# Altium footprint library Connector-Header.PcbLib: 166 footprints (part 6 of 11)
Each footprint in its own frame and in the unit in brackets; x right, y up, seen from the top. Pads: shape width x height; smd on the part's side, far side on the other; paste and mask are expansions set on the pad; w line width, h text height; cw(c..) or ccw(c..) is an arc to the next point about the centre after c.
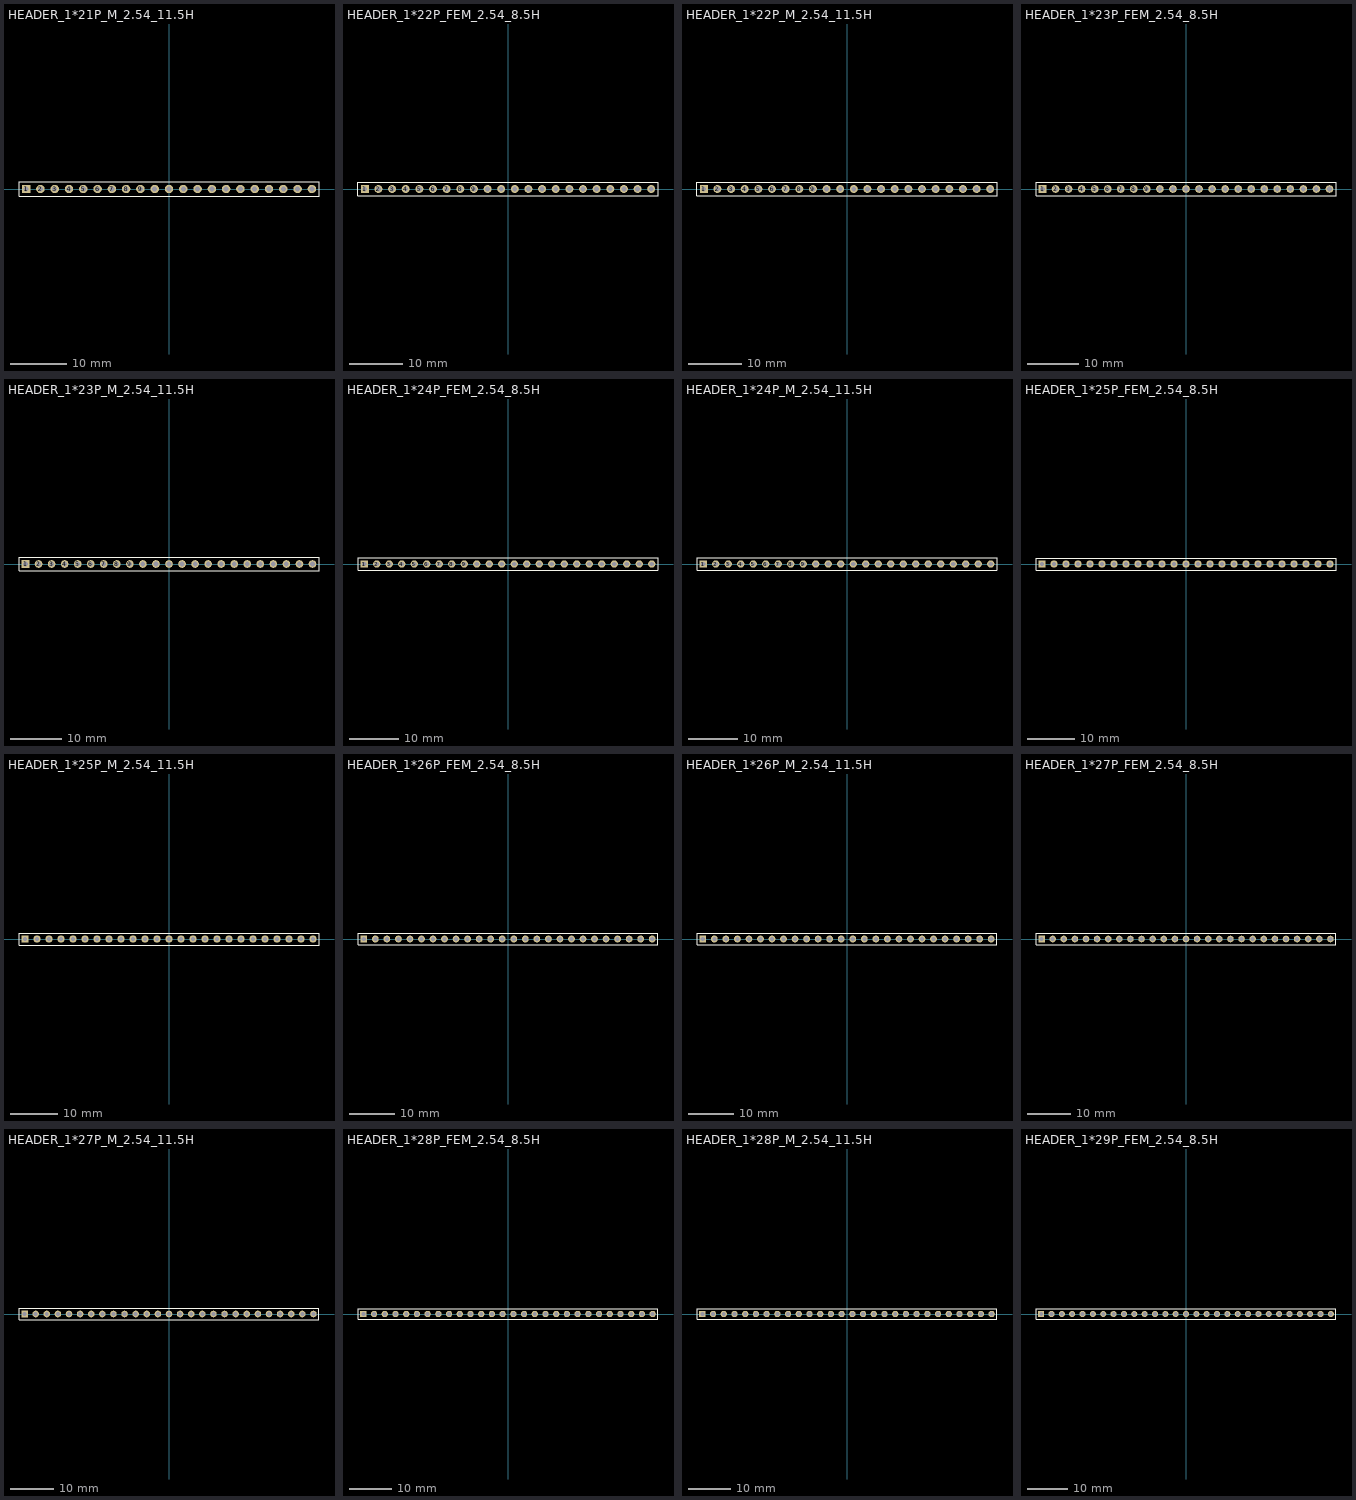
[diagram p5: the footprints below, top view; thin cyan lines are the x and y axes]

## HEADER_1*21P_M_2.54_11.5H [mm] "Connector; Header; 21 Position"
pads (21):
  rect 1.5x1.5 hole 0.9: 1(-25.4,0)
  round 1.5 hole 0.9: 2(-22.86,0) 3(-20.32,0) 4(-17.78,0) 5(-15.24,0) 6(-12.7,0) 7(-10.16,0) 8(-7.62,0) 9(-5.08,0) 10(-2.54,0) 11(0,0) 12(2.54,0) 13(5.08,0) 14(7.62,0) 15(10.16,0) 16(12.7,0) 17(15.24,0) 18(17.78,0) 19(20.32,0) 20(22.86,0) 21(25.4,0)
Top Overlay:
  lines w0.2: -26.67,-1.27 -26.67,1.27 -24.765,1.27 26.67,1.27 26.67,-1.27 -26.67,-1.27
3D body "PinHeader_1x21_P2.54mm_Vertical.step": height 8.54, standoff -3, extent -26.67,-1.27 26.67,1.27

## HEADER_1*22P_FEM_2.54_8.5H [mm] "Connector; Header; 22 Position"
pads (22):
  rect 1.5x1.5 hole 0.9: 1(-26.67,0)
  round 1.5 hole 0.9: 2(-24.13,0) 3(-21.59,0) 4(-19.05,0) 5(-16.51,0) 6(-13.97,0) 7(-11.43,0) 8(-8.89,0) 9(-6.35,0) 10(-3.81,0) 11(-1.27,0) 12(1.27,0) 13(3.81,0) 14(6.35,0) 15(8.89,0) 16(11.43,0) 17(13.97,0) 18(16.51,0) 19(19.05,0) 20(21.59,0) 21(24.13,0) 22(26.67,0)
Top Overlay:
  lines w0.2: 27.889,1.27 -26.035,1.27 -27.94,1.27 -27.94,-1.27 27.94,-1.27 27.94,1.27
3D body "PinSocket_1x22_P2.54mm_Vertical.step": height 7, standoff -3.1, extent -27.94,-1.27 27.94,1.27

## HEADER_1*22P_M_2.54_11.5H [mm] "Connector; Header; 22 Position"
pads (22):
  rect 1.5x1.5 hole 0.9: 1(-26.67,0)
  round 1.5 hole 0.9: 2(-24.13,0) 3(-21.59,0) 4(-19.05,0) 5(-16.51,0) 6(-13.97,0) 7(-11.43,0) 8(-8.89,0) 9(-6.35,0) 10(-3.81,0) 11(-1.27,0) 12(1.27,0) 13(3.81,0) 14(6.35,0) 15(8.89,0) 16(11.43,0) 17(13.97,0) 18(16.51,0) 19(19.05,0) 20(21.59,0) 21(24.13,0) 22(26.67,0)
Top Overlay:
  lines w0.2: 27.889,1.27 -26.035,1.27 -27.94,1.27 -27.94,-1.27 27.94,-1.27 27.94,1.27
3D body "PinHeader_1x22_P2.54mm_Vertical.step": height 8.54, standoff -3, extent -27.94,-1.27 27.94,1.27

## HEADER_1*23P_FEM_2.54_8.5H [mm] "Connector; Header; 23 Position"
pads (23):
  rect 1.5x1.5 hole 0.9: 1(-27.94,0)
  round 1.5 hole 0.9: 2(-25.4,0) 3(-22.86,0) 4(-20.32,0) 5(-17.78,0) 6(-15.24,0) 7(-12.7,0) 8(-10.16,0) 9(-7.62,0) 10(-5.08,0) 11(-2.54,0) 12(0,0) 13(2.54,0) 14(5.08,0) 15(7.62,0) 16(10.16,0) 17(12.7,0) 18(15.24,0) 19(17.78,0) 20(20.32,0) 21(22.86,0) 22(25.4,0) 23(27.94,0)
Top Overlay:
  lines w0.2: -29.21,-1.27 -29.21,1.27 -27.305,1.27 29.21,1.27 29.21,-1.27 -29.21,-1.27
3D body "PinSocket_1x23_P2.54mm_Vertical.step": height 7, standoff -3.1, extent -29.21,-1.27 29.21,1.27

## HEADER_1*23P_M_2.54_11.5H [mm] "Connector; Header; 23 Position"
pads (23):
  rect 1.5x1.5 hole 0.9: 1(-27.94,0)
  round 1.5 hole 0.9: 2(-25.4,0) 3(-22.86,0) 4(-20.32,0) 5(-17.78,0) 6(-15.24,0) 7(-12.7,0) 8(-10.16,0) 9(-7.62,0) 10(-5.08,0) 11(-2.54,0) 12(0,0) 13(2.54,0) 14(5.08,0) 15(7.62,0) 16(10.16,0) 17(12.7,0) 18(15.24,0) 19(17.78,0) 20(20.32,0) 21(22.86,0) 22(25.4,0) 23(27.94,0)
Top Overlay:
  lines w0.2: -29.21,-1.27 29.21,-1.27 29.21,1.27 -27.305,1.27 -29.21,1.27 -29.21,-1.27
3D body "PinHeader_1x23_P2.54mm_Vertical.step": height 8.54, standoff -3, extent -29.21,-1.27 29.21,1.27

## HEADER_1*24P_FEM_2.54_8.5H [mm] "Connector; Header; 24 Position"
pads (24):
  rect 1.5x1.5 hole 0.9: 1(-29.21,0)
  round 1.5 hole 0.9: 2(-26.67,0) 3(-24.13,0) 4(-21.59,0) 5(-19.05,0) 6(-16.51,0) 7(-13.97,0) 8(-11.43,0) 9(-8.89,0) 10(-6.35,0) 11(-3.81,0) 12(-1.27,0) 13(1.27,0) 14(3.81,0) 15(6.35,0) 16(8.89,0) 17(11.43,0) 18(13.97,0) 19(16.51,0) 20(19.05,0) 21(21.59,0) 22(24.13,0) 23(26.67,0) 24(29.21,0)
Top Overlay:
  lines w0.2: 30.455,-1.27 -30.48,-1.27 -30.48,1.27 -28.575,1.27 30.455,1.27 ; 30.48,-1.27 30.48,1.27
3D body "PinSocket_1x24_P2.54mm_Vertical.step": height 7, standoff -3.1, extent -30.48,-1.27 30.48,1.27

## HEADER_1*24P_M_2.54_11.5H [mm] "Connector; Header; 24 Position"
pads (24):
  rect 1.5x1.5 hole 0.9: 1(-29.21,0)
  round 1.5 hole 0.9: 2(-26.67,0) 3(-24.13,0) 4(-21.59,0) 5(-19.05,0) 6(-16.51,0) 7(-13.97,0) 8(-11.43,0) 9(-8.89,0) 10(-6.35,0) 11(-3.81,0) 12(-1.27,0) 13(1.27,0) 14(3.81,0) 15(6.35,0) 16(8.89,0) 17(11.43,0) 18(13.97,0) 19(16.51,0) 20(19.05,0) 21(21.59,0) 22(24.13,0) 23(26.67,0) 24(29.21,0)
Top Overlay:
  lines w0.2: 30.455,-1.27 -30.48,-1.27 -30.48,1.27 -28.575,1.27 30.455,1.27 ; 30.48,-1.27 30.48,1.27
3D body "PinHeader_1x24_P2.54mm_Vertical.step": height 8.54, standoff -3, extent -30.48,-1.27 30.48,1.27

## HEADER_1*25P_FEM_2.54_8.5H [mm] "Connector; Header; 25 Position"
pads (25):
  rect 1.5x1.5 hole 0.9: 1(-30.48,0)
  round 1.5 hole 0.9: 2(-27.94,0) 3(-25.4,0) 4(-22.86,0) 5(-20.32,0) 6(-17.78,0) 7(-15.24,0) 8(-12.7,0) 9(-10.16,0) 10(-7.62,0) 11(-5.08,0) 12(-2.54,0) 13(0,0) 14(2.54,0) 15(5.08,0) 16(7.62,0) 17(10.16,0) 18(12.7,0) 19(15.24,0) 20(17.78,0) 21(20.32,0) 22(22.86,0) 23(25.4,0) 24(27.94,0) 25(30.48,0)
Top Overlay:
  lines w0.2: -31.75,-1.27 -31.75,1.27 -29.845,1.27 31.75,1.27 31.75,-1.27 -31.75,-1.27
3D body "PinSocket_1x25_P2.54mm_Vertical.step": height 7, standoff -3.1, extent -31.75,-1.27 31.75,1.27

## HEADER_1*25P_M_2.54_11.5H [mm] "Connector; Header; 25 Position"
pads (25):
  rect 1.5x1.5 hole 0.9: 1(-30.48,0)
  round 1.5 hole 0.9: 2(-27.94,0) 3(-25.4,0) 4(-22.86,0) 5(-20.32,0) 6(-17.78,0) 7(-15.24,0) 8(-12.7,0) 9(-10.16,0) 10(-7.62,0) 11(-5.08,0) 12(-2.54,0) 13(0,0) 14(2.54,0) 15(5.08,0) 16(7.62,0) 17(10.16,0) 18(12.7,0) 19(15.24,0) 20(17.78,0) 21(20.32,0) 22(22.86,0) 23(25.4,0) 24(27.94,0) 25(30.48,0)
Top Overlay:
  lines w0.2: -31.75,-1.27 31.75,-1.27 31.75,1.27 -29.845,1.27 -31.75,1.27 -31.75,-1.27
3D body "PinHeader_1x25_P2.54mm_Vertical.step": height 8.54, standoff -3, extent -31.75,-1.27 31.75,1.27

## HEADER_1*26P_FEM_2.54_8.5H [mm] "Connector; Header; 26 Position"
pads (26):
  rect 1.5x1.5 hole 0.9: 1(-31.75,0)
  round 1.5 hole 0.9: 2(-29.21,0) 3(-26.67,0) 4(-24.13,0) 5(-21.59,0) 6(-19.05,0) 7(-16.51,0) 8(-13.97,0) 9(-11.43,0) 10(-8.89,0) 11(-6.35,0) 12(-3.81,0) 13(-1.27,0) 14(1.27,0) 15(3.81,0) 16(6.35,0) 17(8.89,0) 18(11.43,0) 19(13.97,0) 20(16.51,0) 21(19.05,0) 22(21.59,0) 23(24.13,0) 24(26.67,0) 25(29.21,0) 26(31.75,0)
Top Overlay:
  lines w0.2: -33.02,-1.27 -33.02,1.27 -31.115,1.27 33.02,1.27 33.02,-1.27 -33.02,-1.27
3D body "PinSocket_1x26_P2.54mm_Vertical.step": height 7, standoff -3.1, extent -33.02,-1.27 33.02,1.27

## HEADER_1*26P_M_2.54_11.5H [mm] "Connector; Header; 26 Position"
pads (26):
  rect 1.5x1.5 hole 0.9: 1(-31.75,0)
  round 1.5 hole 0.9: 2(-29.21,0) 3(-26.67,0) 4(-24.13,0) 5(-21.59,0) 6(-19.05,0) 7(-16.51,0) 8(-13.97,0) 9(-11.43,0) 10(-8.89,0) 11(-6.35,0) 12(-3.81,0) 13(-1.27,0) 14(1.27,0) 15(3.81,0) 16(6.35,0) 17(8.89,0) 18(11.43,0) 19(13.97,0) 20(16.51,0) 21(19.05,0) 22(21.59,0) 23(24.13,0) 24(26.67,0) 25(29.21,0) 26(31.75,0)
Top Overlay:
  lines w0.2: -33.02,-1.27 33.02,-1.27 33.02,1.27 -31.115,1.27 -33.02,1.27 -33.02,-1.27
3D body "PinHeader_1x26_P2.54mm_Vertical.step": height 8.54, standoff -3, extent -33.02,-1.27 33.02,1.27

## HEADER_1*27P_FEM_2.54_8.5H [mm] "Connector; Header; 27 Position"
pads (27):
  rect 1.5x1.5 hole 0.9: 1(-33.02,0)
  round 1.5 hole 0.9: 2(-30.48,0) 3(-27.94,0) 4(-25.4,0) 5(-22.86,0) 6(-20.32,0) 7(-17.78,0) 8(-15.24,0) 9(-12.7,0) 10(-10.16,0) 11(-7.62,0) 12(-5.08,0) 13(-2.54,0) 14(0,0) 15(2.54,0) 16(5.08,0) 17(7.62,0) 18(10.16,0) 19(12.7,0) 20(15.24,0) 21(17.78,0) 22(20.32,0) 23(22.86,0) 24(25.4,0) 25(27.94,0) 26(30.48,0) 27(33.02,0)
Top Overlay:
  lines w0.2: -34.29,-1.27 -34.29,1.27 -32.385,1.27 34.29,1.27 34.29,-1.27 -34.29,-1.27
3D body "PinSocket_1x27_P2.54mm_Vertical.step": height 7, standoff -3.1, extent -34.29,-1.27 34.29,1.27

## HEADER_1*27P_M_2.54_11.5H [mm] "Connector; Header; 27 Position"
pads (27):
  rect 1.5x1.5 hole 0.9: 1(-33.02,0)
  round 1.5 hole 0.9: 2(-30.48,0) 3(-27.94,0) 4(-25.4,0) 5(-22.86,0) 6(-20.32,0) 7(-17.78,0) 8(-15.24,0) 9(-12.7,0) 10(-10.16,0) 11(-7.62,0) 12(-5.08,0) 13(-2.54,0) 14(0,0) 15(2.54,0) 16(5.08,0) 17(7.62,0) 18(10.16,0) 19(12.7,0) 20(15.24,0) 21(17.78,0) 22(20.32,0) 23(22.86,0) 24(25.4,0) 25(27.94,0) 26(30.48,0) 27(33.02,0)
Top Overlay:
  lines w0.2: -34.29,-1.27 34.29,-1.27 34.29,1.27 -32.385,1.27 -34.29,1.27 -34.29,-1.27
3D body "PinHeader_1x27_P2.54mm_Vertical.step": height 8.54, standoff -3, extent -34.29,-1.27 34.29,1.27

## HEADER_1*28P_FEM_2.54_8.5H [mm] "Connector; Header; 28 Position"
pads (28):
  rect 1.5x1.5 hole 0.9: 1(-34.29,0)
  round 1.5 hole 0.9: 2(-31.75,0) 3(-29.21,0) 4(-26.67,0) 5(-24.13,0) 6(-21.59,0) 7(-19.05,0) 8(-16.51,0) 9(-13.97,0) 10(-11.43,0) 11(-8.89,0) 12(-6.35,0) 13(-3.81,0) 14(-1.27,0) 15(1.27,0) 16(3.81,0) 17(6.35,0) 18(8.89,0) 19(11.43,0) 20(13.97,0) 21(16.51,0) 22(19.05,0) 23(21.59,0) 24(24.13,0) 25(26.67,0) 26(29.21,0) 27(31.75,0) 28(34.29,0)
Top Overlay:
  lines w0.2: -35.56,-1.27 -35.56,1.27 -33.655,1.27 35.56,1.27 35.56,-1.27 -35.56,-1.27
3D body "PinSocket_1x28_P2.54mm_Vertical.step": height 7, standoff -3.1, extent -35.56,-1.27 35.56,1.27

## HEADER_1*28P_M_2.54_11.5H [mm] "Connector; Header; 28 Position"
pads (28):
  rect 1.5x1.5 hole 0.9: 1(-34.29,0)
  round 1.5 hole 0.9: 2(-31.75,0) 3(-29.21,0) 4(-26.67,0) 5(-24.13,0) 6(-21.59,0) 7(-19.05,0) 8(-16.51,0) 9(-13.97,0) 10(-11.43,0) 11(-8.89,0) 12(-6.35,0) 13(-3.81,0) 14(-1.27,0) 15(1.27,0) 16(3.81,0) 17(6.35,0) 18(8.89,0) 19(11.43,0) 20(13.97,0) 21(16.51,0) 22(19.05,0) 23(21.59,0) 24(24.13,0) 25(26.67,0) 26(29.21,0) 27(31.75,0) 28(34.29,0)
Top Overlay:
  lines w0.2: -35.56,-1.27 35.56,-1.27 35.56,1.27 -33.655,1.27 -35.56,1.27 -35.56,-1.27
3D body "PinHeader_1x28_P2.54mm_Vertical.step": height 8.54, standoff -3, extent -35.56,-1.27 35.56,1.27

## HEADER_1*29P_FEM_2.54_8.5H [mm] "Connector; Header; 29 Position"
pads (29):
  rect 1.5x1.5 hole 0.9: 1(-35.56,0)
  round 1.5 hole 0.9: 2(-33.02,0) 3(-30.48,0) 4(-27.94,0) 5(-25.4,0) 6(-22.86,0) 7(-20.32,0) 8(-17.78,0) 9(-15.24,0) 10(-12.7,0) 11(-10.16,0) 12(-7.62,0) 13(-5.08,0) 14(-2.54,0) 15(0,0) 16(2.54,0) 17(5.08,0) 18(7.62,0) 19(10.16,0) 20(12.7,0) 21(15.24,0) 22(17.78,0) 23(20.32,0) 24(22.86,0) 25(25.4,0) 26(27.94,0) 27(30.48,0) 28(33.02,0) 29(35.56,0)
Top Overlay:
  lines w0.2: -36.83,-1.27 36.83,-1.27 36.83,1.27 -34.925,1.27 -36.83,1.27 -36.83,-1.27
3D body "PinSocket_1x29_P2.54mm_Vertical.step": height 7, standoff -3.1, extent -36.83,-1.27 36.83,1.27